# Altium footprint library Cyberdeck.PcbLib: 261 footprints (part 6 of 17)
Each footprint in its own frame and in the unit in brackets; x right, y up, seen from the top. Pads: shape width x height; smd on the part's side, far side on the other; paste and mask are expansions set on the pad; w line width, h text height; cw(c..) or ccw(c..) is an arc to the next point about the centre after c.
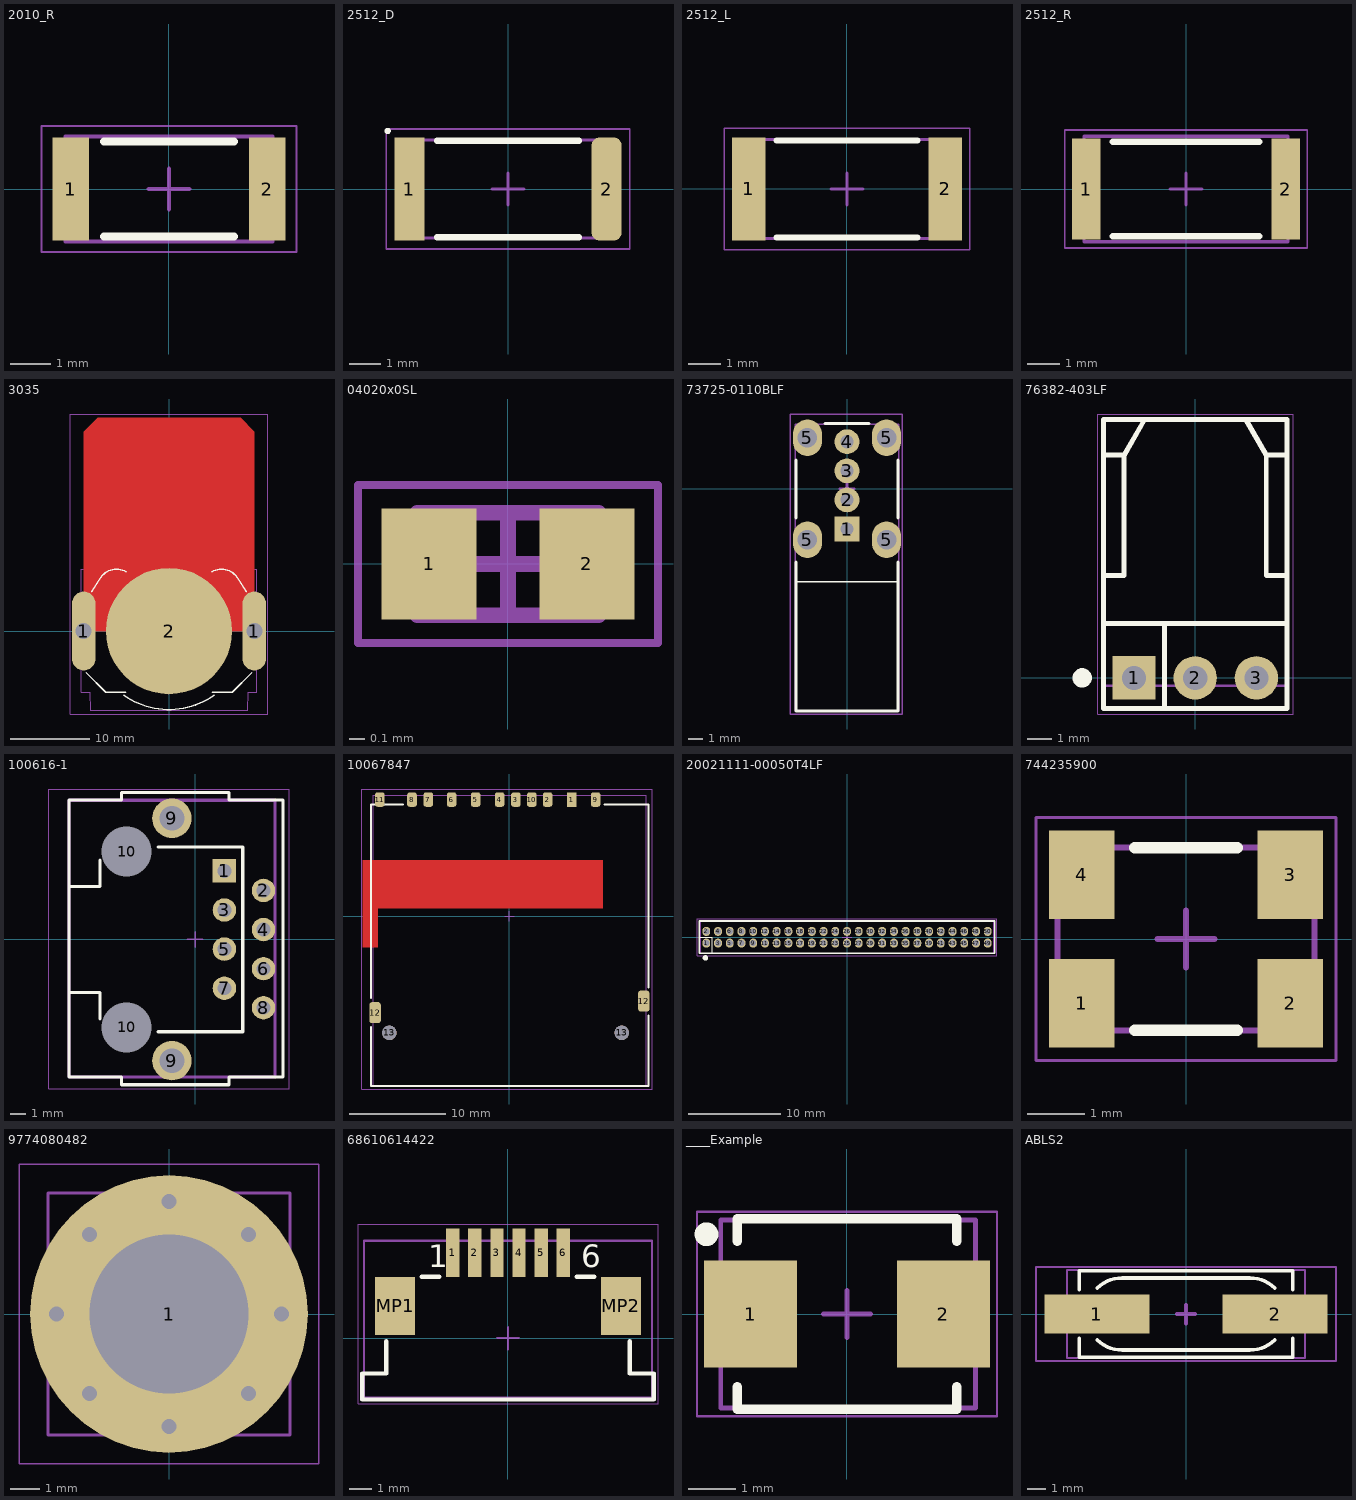
[diagram p5: the footprints below, top view; thin cyan lines are the x and y axes]

## 2010_R [mm] "2010_R"
height 0.55
pads (2):
  rect 0.9x2.55 smd: 1(-2.425,0) 2(2.425,0)
Top Overlay:
  lines w0.2: -1.6,-1.175 1.6,-1.175 ; -1.6,1.175 1.6,1.175
Assembly Top:
  lines w0.1: -2.55,-1.3 2.55,-1.3 2.55,1.3 -2.55,1.3 -2.55,-1.3
Courtyard Top:
  lines w0.05: -3.15,-1.55 3.15,-1.55 3.15,1.55 -3.15,1.55 -3.15,-1.55
  lines w0.1: -0.5,0 0.5,0 ; 0,-0.5 0,0.5
3D body "RESC-2010.stp": height 0.65, standoff 0, extent -2.55,-1.3 2.55,1.3

## 2512_D [mm] "2512_D"
height 0.55
pads (2):
  rect 0.95x3.25 smd: 1(-3.125,0)
  rrect50% 0.95x3.25 smd: 2(3.125,0)
Top Overlay:
  circle w0.1: c-3.812,1.837 r0.05
  lines w0.2: -2.25,-1.525 2.25,-1.525 ; -2.25,1.525 2.25,1.525
Assembly Top:
  lines w0.1: -3.175,-1.55 -3.175,1.55 3.175,1.55 3.175,-1.55 -3.175,-1.55
Courtyard Top:
  lines w0.05: -3.85,-1.9 -3.85,1.9 3.85,1.9 3.85,-1.9 -3.85,-1.9
  lines w0.1: -0.5,0 0.5,0 ; 0,-0.5 0,0.5
3D body: height 0.55, standoff 0, extent -2.625,-1.55 2.625,1.55
3D body: height 0.55, standoff 0, extent -3.175,-1.55 -2.625,1.55
3D body: height 0.55, standoff 0, extent 2.625,-1.55 3.175,1.55

## 2512_L [mm] "2512_L"
height 0.55
pads (2):
  rect 1.04x3.24 smd: 1(-3.08,0) 2(3.08,0)
Top Overlay:
  lines w0.2: -2.2,-1.52 2.2,-1.52 ; -2.2,1.52 2.2,1.52
Assembly Top:
  lines w0.1: -3.175,-1.55 -3.175,1.55 3.175,1.55 3.175,-1.55 -3.175,-1.55
Courtyard Top:
  lines w0.05: -3.85,-1.9 -3.85,1.9 3.85,1.9 3.85,-1.9 -3.85,-1.9
  lines w0.1: -0.5,0 0.5,0 ; 0,-0.5 0,0.5
3D body: height 0.55, standoff 0, extent -2.625,-1.55 2.625,1.55
3D body: height 0.55, standoff 0, extent -3.175,-1.55 -2.625,1.55
3D body: height 0.55, standoff 0, extent 2.625,-1.55 3.175,1.55

## 2512_R [mm] "2512_R"
height 0.55
pads (2):
  rect 0.9x3.15 smd: 1(-3.125,0) 2(3.125,0)
Top Overlay:
  lines w0.2: -2.3,-1.475 2.3,-1.475 ; -2.3,1.475 2.3,1.475
Assembly Top:
  lines w0.1: -3.2,-1.65 -3.2,1.65 3.2,1.65 3.2,-1.65 -3.2,-1.65
Courtyard Top:
  lines w0.05: -3.8,-1.85 -3.8,1.85 3.8,1.85 3.8,-1.85 -3.8,-1.85
  lines w0.1: -0.5,0 0.5,0 ; 0,-0.5 0,0.5
3D body "RESC-2512.stp": height 0.65, standoff 0, extent -3.2,-1.65 3.2,1.65

## 3035 [mm] "Keystone 3035"
height 4.35
pads (3):
  oval 3x10 / inner round 3 / far side round 4 hole 2.03: 1(-10.8,0) 1(10.8,0)
  round 16 smd paste-20 mask+1: 2(0,0)
Top Layer:
  pour cut-out: -10.775,0 -10.775,25.25 -9.025,27 9.075,27 10.825,25.25 10.825,0
Top Overlay:
  lines w0.2: -10.5,-5.25 -8,-7.75 -5.5,-7.75 ; -9.761,5.007 -8.614,6.832 cw(c-6.644,5.42) -5.434,7.521 ; -5.721,-8.129 ccw(c0,0) 5.7,-8.143 ; 5.434,7.521 cw(c6.644,5.42) 8.614,6.832 9.761,5.007 ; 5.5,-7.75 8,-7.75 10.5,-5.25
Assembly Top:
  lines w0.1: 11.123,-7.75 10.008,-7.75 10,-10 -9.999,-10 -10.007,-7.75 -11.123,-7.75 ; 11.123,-4.823 11.123,-4.823 ; 11.123,7.84 10.008,7.84 10,10 -10,10 -10.007,7.84 -11.123,7.84 ; 11.123,-7.75 11.123,7.84 ; -11.123,-7.75 -11.123,7.84 ; -11.123,-7.75 -11.123,-7.75 ; -11.123,7.84 -11.123,7.84
Courtyard Top:
  lines w0.05: -12.5,-10.5 12.5,-10.5 12.5,27.5 -12.5,27.5 -12.5,-10.5
  lines w0.1: -0.5,0 0.5,0 ; 0,-0.5 0,0.5
3D body: height 10.6, standoff -10, extent 10.8,0 10.8,0
3D body "keystone-PN3035.STEP": height 4.41, standoff -2.71, extent -11.123,-7.75 11.123,7.84
3D body: height 0.35, standoff -15.24, extent 11.123,-7.75 11.123,-7.75
3D body "User Library-CR 2032 Lithium Cell.step": height 3.21, standoff 0.01, extent -10,-10 10,10
3D body: height 0.35, standoff -15.24, extent -11.123,-7.75 -11.123,-7.75

## 04020x0SL [mm] "04020x0SL, Resettable PTC"
height 0.6
pads (2):
  rect 0.6x0.7 smd: 1(-0.5,0) 2(0.5,0)
Assembly Top:
  lines w0.1: -0.575,-0.325 0.575,-0.325 0.575,0.325 -0.575,0.325 -0.575,-0.325
Courtyard Top:
  lines w0.05: -0.95,-0.5 0.95,-0.5 0.95,0.5 -0.95,0.5 -0.95,-0.5
  lines w0.1: -0.325,0 0.325,0 ; 0,-0.325 0,0.325
3D body "RESC1005X06N.step": height 0.6, standoff 0, extent -0.575,-0.325 0.575,0.325

## 73725-0110BLF [mm] "73725-0110BLF"
height 13
pads (8):
  rect 1.7x1.7 hole 0.92: 1(0,-2.77)
  round 1.7 hole 0.92: 2(0,-0.77) 3(0,1.23) 4(0,3.23)
  oval 2x2.5 hole 1.35: 5(-2.72,-3.5) 5(-2.72,3.5) 5(2.72,-3.5) 5(2.72,3.5)
Top Overlay:
  lines w0.1: -3.5,-6.39 3.5,-6.39
  lines w0.2: -3.5,-5.02 -3.5,-15.27 3.5,-15.27 3.5,-5.02 ; -3.5,-2.02 -3.5,1.98 ; -1.5,4.48 1.5,4.48 ; 3.5,-2.02 3.5,1.98
Assembly Top:
  lines w0.1: -3.55,-15.27 3.55,-15.27 3.55,4.43 -3.55,4.43 -3.55,-15.27
Courtyard Top:
  lines w0.1: -3.9,-15.47 3.8,-15.47 3.8,5.13 -3.9,5.13 -3.9,-15.47
  lines w0.2: -0.5,0 0.5,0 ; 0,-0.5 0,0.5
3D body "73725-0110blfc.stp": height 14.33, standoff -3.49, extent -3.567,-15.233 3.562,4.467

## 76382-403LF [mm] "76382-403LF"
height 5.3
pads (3):
  rect 1.8x1.8 hole 1: 1(-2.54,0)
  round 1.8 hole 1: 2(0,0) 3(2.54,0)
Top Overlay:
  circle w0.5: c-4.69,0 r0.15
  lines w0.2: -3.81,2.25 -1.27,2.25 ; -3.75,4.25 -2.95,4.25 -2.95,9.25 ; -3.75,9.25 -2.95,9.25 ; -2.108,10.708 -2.95,9.25 ; -1.27,-1.27 -1.27,2.25 ; 2.102,10.719 2.95,9.25 ; 3.75,4.25 2.95,4.25 2.95,9.25 ; 3.75,9.25 2.95,9.25 ; 3.8,2.25 -1.27,2.25 ; -3.81,-1.27 3.81,-1.27 3.81,10.725 -3.81,10.725 -3.81,-1.27
Assembly Top:
  lines w0.1: -3.81,-0.325 -3.81,10.75 3.81,10.75 3.81,-0.325 -3.81,-0.325
Courtyard Top:
  lines w0.05: -4.04,-1.5 -4.04,10.95 4.075,10.95 4.075,-1.5 -4.04,-1.5
  lines w0.1: -0.5,0 0.5,0 ; 0,-0.5 0,0.5
3D body "76382-403LFc.stp": height 5.35, standoff -3.39, extent -3.765,-0.308 3.765,10.74

## 100616-1 [mm] "100616-1"
height 16.7
pads (12):
  rect 1.524x1.524 hole 0.89: 1(1.91,4.455)
  round 1.524 hole 0.89: 2(4.45,3.185) 3(1.91,1.915) 4(4.45,0.645) 5(1.91,-0.625) 6(4.45,-1.895) 7(1.91,-3.165) 8(4.45,-4.435)
  round 2.57 hole 1.6: 9(-1.5,-7.875) 9(-1.5,7.875)
  round 1.524 hole 3.25 unplated: 10(-4.45,-5.715) 10(-4.45,5.715)
Top Overlay:
  lines w0.2: -8.19,-3.455 -6.19,-3.455 -6.19,-5.155 ; -8.19,3.455 -6.19,3.455 -6.19,5.155 ; -2.4,-6 3.1,-6 3.1,6 -2.4,6 ; -8.19,-8.945 -8.19,9.055 -4.79,9.055 -4.79,9.555 2.21,9.555 2.21,9.055 5.71,9.055 5.71,-8.945 2.21,-8.945 2.21,-9.445 -4.79,-9.445 -4.79,-8.945 -8.19,-8.945
Assembly Top:
  lines w0.2: -8.2,-8.95 -8.2,9.05 5.2,9.05 5.2,-8.95 -8.2,-8.95
Courtyard Top:
  lines w0.05: -9.495,-9.72 6.11,-9.72 6.11,9.78 -9.495,9.78 -9.495,-9.72
  lines w0.1: -0.5,0 0.5,0 ; 0,-0.5 0,0.5
3D body "c-100616-1-g-3d.stp": height 16.66, standoff -3.19, extent -8.2,-8.95 5.2,9.05

## 10067847 [mm] "CONN SD CARD PUSH-PUSH SMD"
height 2.8
pads (15):
  rect 1x1.5 smd: 1(6.475,12.15)
  rrect50% 1x1.5 smd: 2(3.975,12.15) 3(0.675,12.15) 4(-1.025,12.15) 5(-3.525,12.15) 6(-6.025,12.15) 7(-8.45,12.15) 8(-10.15,12.15) 9(8.975,12.15) 10(2.325,12.15) 11(-13.5,12.15)
  rrect50% 1.2x2.2 smd: 12(-14,-10.05) 12(14,-8.85)
  round 1.5 hole 1.5: 13(-12.5,-12.15) 13(11.7,-12.15)
Top Layer:
  pour cut-out: -15.3,-3.25 -13.7,-3.25 -13.7,0.85 9.7,0.85 9.7,5.85 -15.3,5.85
Top Overlay:
  lines w0.2: -14.4,-11.55 -14.4,-17.7 14.5,-17.7 14.5,-10.35 ; -14.4,-8.55 -14.4,11.65 -11.1,11.65 ; 9.9,11.65 14.5,11.65 14.5,-7.45
Assembly Top:
  lines w0.1: -14.2,-17.65 14.25,-17.65 14.25,12.6 -14.2,12.6 -14.2,-17.65
Courtyard Top:
  lines w0.05: -15.4,-18 -15.4,13.25 14.9,13.25 14.9,-18 -15.4,-18
  lines w0.1: -0.5,0 0.5,0 ; 0,-0.5 0,0.5
3D body "10067847-001RLF.stp": height 2.91, standoff -0.69, extent -14.2,-17.65 14.25,12.6

## 20021111-00050T4LF [mm] "CONN HEADER 50POS UNSHD VERT T/H"
height 8
pads (50):
  oval 0.85x1 hole 0.65: 1(-15.24,-0.635) 2(-15.24,0.635) 3(-13.97,-0.635) 4(-13.97,0.635) 5(-12.7,-0.635) 6(-12.7,0.635) 7(-11.43,-0.635) 8(-11.43,0.635) 9(-10.16,-0.635) 10(-10.16,0.635) 11(-8.89,-0.635) 12(-8.89,0.635) 13(-7.62,-0.635) 14(-7.62,0.635) 15(-6.35,-0.635) 16(-6.35,0.635) 17(-5.08,-0.635) 18(-5.08,0.635) 19(-3.81,-0.635) 20(-3.81,0.635) 21(-2.54,-0.635) 22(-2.54,0.635) 23(-1.27,-0.635) 24(-1.27,0.635) 25(0,-0.635) 26(0,0.635) 27(1.27,-0.635) 28(1.27,0.635) 29(2.54,-0.635) 30(2.54,0.635) 31(3.81,-0.635) 32(3.81,0.635) 33(5.08,-0.635) 34(5.08,0.635) 35(6.35,-0.635) 36(6.35,0.635) 37(7.62,-0.635) 38(7.62,0.635) 39(8.89,-0.635) 40(8.89,0.635) 41(10.16,-0.635) 42(10.16,0.635) 43(11.43,-0.635) 44(11.43,0.635) 45(12.7,-0.635) 46(12.7,0.635) 47(13.97,-0.635) 48(13.97,0.635) 49(15.24,-0.635) 50(15.24,0.635)
Top Overlay:
  lines w0.1: -16,0 -14.6,0 -14.6,-1.7
  lines w0.2: -16,-1.735 16,-1.735 16,1.765 -16,1.765 -16,-1.735
  lines w0.3: -15.214,-2.172 ccw(c-15.34,-2.235) -15.206,-2.19
Assembly Top:
  lines w0.1: -15.865,-1.714 -15.865,1.715 15.885,1.715 15.885,-1.714 -15.865,-1.714
Courtyard Top:
  lines w0.05: -16.25,-2 16.25,-2 16.25,2 -16.25,2 -16.25,-2
  lines w0.1: -0.5,0 0.5,0 ; 0,-1 0,0.5
3D body "FTS-125-01-L-D.stp": height 3.92, standoff -2.27, extent -15.865,-1.714 15.885,1.715

## 744235900 [mm] "744235900"
height 1.1
pads (4):
  rect 1.15x1.55 smd: 1(-1.825,-1.125) 2(1.825,-1.125) 3(1.825,1.125) 4(-1.825,1.125)
Top Overlay:
  lines w0.2: -0.9,-1.6 0.9,-1.6 ; -0.9,1.6 0.9,1.6
Assembly Top:
  lines w0.1: -2.25,-1.6 -2.25,1.6 2.25,1.6 2.25,-1.6 -2.25,-1.6
Courtyard Top:
  lines w0.05: -2.625,-2.125 -2.625,2.125 2.625,2.125 2.625,-2.125 -2.625,-2.125
  lines w0.1: -0.5,0 0.5,0 ; 0,-0.5 0,0.5
3D body: height 0.43, standoff -0.43, extent 0.1,0.8 0.1,0.8
3D body "STEP-WE-CNSW-1812-rev1.stp": height 2.81, standoff -0.04, extent -2.25,-1.6 2.25,1.6

## 9774080482 [mm] "WA-SMSI SMT Steel Spacer, M4"
height 8
pads (1):
  round 9.4 hole 5.4 unplated: 1(0,0)
via 0,3.81 diameter 1 hole 0.5
via -2.694,2.694 diameter 1 hole 0.5
via -3.81,0 diameter 1 hole 0.5
via -2.694,-2.694 diameter 1 hole 0.5
via 0,-3.81 diameter 1 hole 0.5
via 2.694,-2.694 diameter 1 hole 0.5
via 3.81,0 diameter 1 hole 0.5
via 2.694,2.694 diameter 1 hole 0.5
Top Paste:
  region: 0.399,2.771 0.62,2.73 1.049,2.596 1.451,2.395 1.815,2.132 2.132,1.815 2.395,1.451 2.596,1.049 2.73,0.62 2.771,0.399 2.775,0.4 4.575,0.4 4.583,0.401 4.559,0.668 4.451,1.192 4.282,1.701 4.056,2.187 3.775,2.643 3.442,3.063 3.063,3.442 2.643,3.775 2.187,4.056 1.701,4.282 1.192,4.451 0.668,4.559 0.401,4.583 0.4,4.575
  region: -2.771,0.399 -2.73,0.62 -2.596,1.049 -2.395,1.451 -2.132,1.815 -1.815,2.132 -1.451,2.395 -1.049,2.596 -0.62,2.73 -0.399,2.771 -0.4,2.775 -0.4,4.575 -0.401,4.583 -0.668,4.559 -1.192,4.451 -1.701,4.282 -2.187,4.056 -2.643,3.775 -3.063,3.442 -3.442,3.063 -3.775,2.643 -4.056,2.187 -4.282,1.701 -4.451,1.192 -4.559,0.668 -4.583,0.401 -4.575,0.4
  region: -0.399,-2.771 -0.62,-2.73 -1.049,-2.596 -1.451,-2.395 -1.815,-2.132 -2.132,-1.815 -2.395,-1.451 -2.596,-1.049 -2.73,-0.62 -2.771,-0.399 -2.775,-0.4 -4.575,-0.4 -4.583,-0.401 -4.559,-0.668 -4.451,-1.192 -4.282,-1.701 -4.056,-2.187 -3.775,-2.643 -3.442,-3.063 -3.063,-3.442 -2.643,-3.775 -2.187,-4.056 -1.701,-4.282 -1.192,-4.451 -0.668,-4.559 -0.401,-4.583 -0.4,-4.575
  region: 2.771,-0.399 2.73,-0.62 2.596,-1.049 2.395,-1.451 2.132,-1.815 1.815,-2.132 1.451,-2.395 1.049,-2.596 0.62,-2.73 0.399,-2.771 0.4,-2.775 0.4,-4.575 0.401,-4.583 0.668,-4.559 1.192,-4.451 1.701,-4.282 2.187,-4.056 2.643,-3.775 3.063,-3.442 3.442,-3.063 3.775,-2.643 4.056,-2.187 4.282,-1.701 4.451,-1.192 4.559,-0.668 4.583,-0.401 4.575,-0.4
  lines w0.05: -4.583,-0.401 ccw(c0,0) -0.401,-4.583 ; -4.583,0.401 cw(c0,0) -0.401,4.583 ; -4.575,-0.4 -2.775,-0.4 ; -4.575,0.4 -2.775,0.4 ; -2.771,-0.399 ccw(c0,0) -0.399,-2.771 ; -2.771,0.399 cw(c0,0) -0.399,2.771 ; -0.4,-4.575 -0.4,-2.775 ; -0.4,2.775 -0.4,4.575 ; 0.401,-4.583 ccw(c0,0) 4.583,-0.401 ; 0.4,-4.575 0.4,-2.775 ; 0.399,-2.771 ccw(c0,0) 2.771,-0.399 ; 0.399,2.771 cw(c0,0) 2.771,0.399 ; 0.4,2.775 0.4,4.575 ; 0.401,4.583 cw(c0,0) 4.583,0.401 ; 2.775,-0.4 4.575,-0.4 ; 2.775,0.4 4.575,0.4
Assembly Top:
  lines w0.1: -4.1,-4.1 -4.1,4.1 4.1,4.1 4.1,-4.1 -4.1,-4.1
Courtyard Top:
  lines w0.05: -5.08,-5.08 5.08,-5.08 5.08,5.08 -5.08,5.08 -5.08,-5.08
  lines w0.1: -0.5,0 0.5,0 ; 0,-0.5 0,0.5
3D body "Download_STP_9774080482 (rev1).stp": height 8, standoff -1.4, extent -4.1,-4.1 4.1,4.1

## 68610614422 [mm] "ZIF Connectors, Horizontal, Bottom Contact, pitch 1mm, 6p"
height 3.15
pads (8):
  rect 0.6x2.2 smd: 1(-2.5,3.85) 2(-1.5,3.85) 3(-0.5,3.85) 4(0.5,3.85) 5(1.5,3.85) 6(2.5,3.85)
  rect 1.8x2.6 smd: MP1(-5.1,1.45) MP2(5.1,1.45)
Top Overlay:
  lines w0.2: -5.5,-0.15 -5.5,-1.6 -6.575,-1.6 -6.575,-2.775 6.575,-2.775 6.575,-1.6 5.5,-1.6 5.5,-0.15 ; -3.9,2.775 -3.1,2.775 ; 3.1,2.775 3.9,2.775
  text "1" at -3.6,3.2 h1.02
  text "6" at 3.3,3.2 h1.02
Assembly Top:
  lines w0.1: -6.5,-2.7 -6.5,4.4 6.5,4.4 6.5,4.4 6.5,-2.7 -6.5,-2.7
Courtyard Top:
  lines w0.05: -6.775,-2.975 6.775,-2.975 6.775,5.15 -6.775,5.15 -6.775,-2.975
  lines w0.1: -0.5,0 0.5,0 ; 0,-0.5 0,0.5
3D body "68610614422.stp": height 3.02, standoff 0.01, extent -6.5,-2.7 6.5,4.4

## ____Example [mm] "SODFL, 2-Leads, Body 3.63x5.35mm, IPC Medium Density"
height 1.1
pads (2):
  rect 1.95x2.25 smd: 1(-2.025,0) 2(2.025,0)
Top Overlay:
  circle w0.25: c-2.95,1.675 r0.125
  lines w0.2: -2.3,-1.525 -2.3,-2 2.3,-2 2.3,-1.525 ; -2.3,1.525 -2.3,2 2.3,2 2.3,1.525
Assembly Top:
  lines w0.1: -2.65,-1.975 -2.65,1.975 2.7,1.975 2.7,-1.975 -2.65,-1.975
Courtyard Top:
  lines w0.05: -3.15,-2.15 3.15,-2.15 3.15,2.15 -3.15,2.15 -3.15,-2.15
  lines w0.1: -0.5,0 0.5,0 ; 0,-0.5 0,0.5
3D body "SODFL535X110-2N.step": height 1.1, standoff 0, extent -2.675,-1.975 2.675,1.975

## ABLS2 [mm] "CRYSTAL Abracon LLC"
height 3.3
pads (2):
  rect 5.6x2.1 smd: 1(-4.75,0) 2(4.75,0)
Top Overlay:
  lines w0.2: -5.7,-1.3 -5.7,-2.3 5.7,-2.3 5.7,-1.3 ; -5.7,1.3 -5.7,2.3 5.7,2.3 5.7,1.3 ; -4.735,-1.385 ccw(c-3.4,0) -3.4,-1.924 3.4,-1.924 ccw(c3.4,0) 4.735,-1.385 ; -4.735,1.385 cw(c-3.4,0) -3.4,1.924 3.4,1.924 cw(c3.4,0) 4.735,1.385
Assembly Top:
  lines w0.1: -6.35,-2.349 -6.35,2.349 6.35,2.349 6.35,-2.349 -6.35,-2.349
Courtyard Top:
  lines w0.1: -8,-2.5 -8,2.5 8,2.5 8,-2.5 -8,-2.5
  lines w0.2: -0.5,0 0.5,0 ; 0,-0.5 0,0.5
3D body "ABLS2.STEP": height 3.28, standoff 0.01, extent -6.35,-2.349 6.35,2.35